# Altium integrated library WS-DITU.intlib: 38 symbols
Pins are listed as number, name and electrical type; pins without a type are passive.

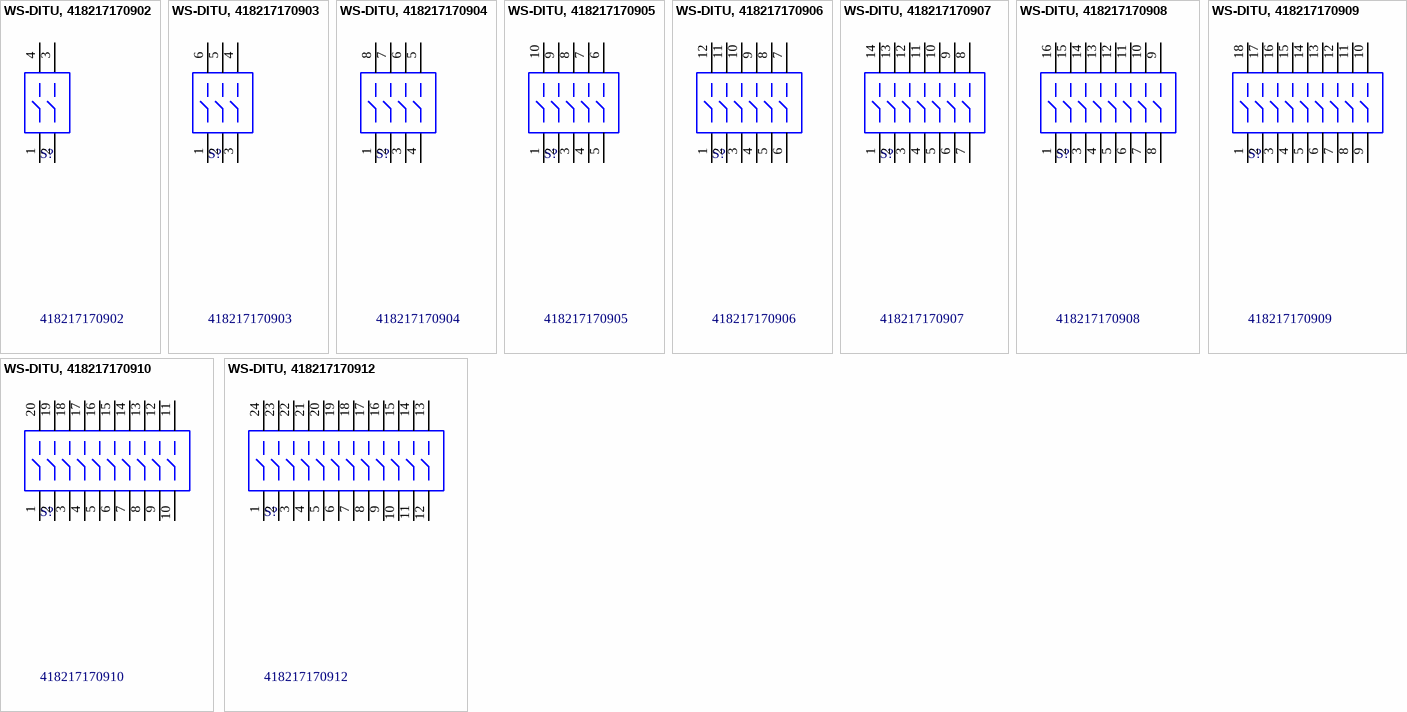
[diagram p0: symbols WS-DITU, 418217170902 to WS-DITU, 418217170912]

## WS-DITU, 418217170902
designator S?, comment 418217170902
WS-DITU 2.54 mm compact THT right angled with flat actuator; Manufacturer: Wurth Elektronik; ComponentLink1 Description: Manufacturer; ComponentLink2 Description: Datasheet; NoPoles: 2; Created Date: Dec.2015; partNo: 418217170902; ComponentLink1URL: http://www.we-online.com; ComponentLink2URL: http://katalog.we-online.de/em/datasheet/4182171709xx.pdf; Created by: Baojun Chen
footprint 418217170902 (02p, 2.54mm Pitch, Right Angled, Box Type, THT, flat Actuator, red, without Tape, Tube)
pins: 1, 2, 3, 4

## WS-DITU, 418217170903
designator S?, comment 418217170903
WS-DITU 2.54 mm compact THT right angled with flat actuator; Manufacturer: Wurth Elektronik; ComponentLink1 Description: Manufacturer; ComponentLink2 Description: Datasheet; NoPoles: 3; Created Date: Dec.2015; partNo: 418217170903; ComponentLink1URL: http://www.we-online.com; ComponentLink2URL: http://katalog.we-online.de/em/datasheet/4182171709xx.pdf; Created by: Baojun Chen
footprint 418217170903 (03p, 2.54mm Pitch, Right Angled, Box Type, THT, flat Actuator, red, without Tape, Tube)
pins: 1, 2, 3, 4, 5, 6

## WS-DITU, 418217170904
designator S?, comment 418217170904
WS-DITU 2.54 mm compact THT right angled with flat actuator; Manufacturer: Wurth Elektronik; ComponentLink1 Description: Manufacturer; ComponentLink2 Description: Datasheet; NoPoles: 4; Created Date: Dec.2015; partNo: 418217170904; ComponentLink1URL: http://www.we-online.com; ComponentLink2URL: http://katalog.we-online.de/em/datasheet/4182171709xx.pdf; Created by: Baojun Chen
footprint 418217170904 (04p, 2.54mm Pitch, Right Angled, Box Type, THT, flat Actuator, red, without Tape, Tube)
pins: 1, 2, 3, 4, 5, 6, 7, 8

## WS-DITU, 418217170905
designator S?, comment 418217170905
WS-DITU 2.54 mm compact THT right angled with flat actuator; Manufacturer: Wurth Elektronik; ComponentLink1 Description: Manufacturer; ComponentLink2 Description: Datasheet; NoPoles: 5; Created Date: Dec.2015; partNo: 418217170905; ComponentLink1URL: http://www.we-online.com; ComponentLink2URL: http://katalog.we-online.de/em/datasheet/4182171709xx.pdf; Created by: Baojun Chen
footprint 418217170905 (05p, 2.54mm Pitch, Right Angled, Box Type, THT, flat Actuator, red, without Tape, Tube)
pins: 1, 2, 3, 4, 5, 6, 7, 8, 9, 10

## WS-DITU, 418217170906
designator S?, comment 418217170906
WS-DITU 2.54 mm compact THT right angled with flat actuator; Manufacturer: Wurth Elektronik; ComponentLink1 Description: Manufacturer; ComponentLink2 Description: Datasheet; NoPoles: 6; Created Date: Dec.2015; partNo: 418217170906; ComponentLink1URL: http://www.we-online.com; ComponentLink2URL: http://katalog.we-online.de/em/datasheet/4182171709xx.pdf; Created by: Baojun Chen
footprint 418217170906 (06p, 2.54mm Pitch, Right Angled, Box Type, THT,flat Actuator, red, without Tape, Tube)
pins: 1, 2, 3, 4, 5, 6, 7, 8, 9, 10, 11, 12

## WS-DITU, 418217170907
designator S?, comment 418217170907
WS-DITU 2.54 mm compact THT right angled with flat actuator; Manufacturer: Wurth Elektronik; ComponentLink1 Description: Manufacturer; ComponentLink2 Description: Datasheet; NoPoles: 7; Created Date: Dec.2015; partNo: 418217170907; ComponentLink1URL: http://www.we-online.com; ComponentLink2URL: http://katalog.we-online.de/em/datasheet/4182171709xx.pdf; Created by: Baojun Chen
footprint 418217170907 (07p, 2.54mm Pitch, Right Angled, Box Type, THT, flat Actuator, red, without Tape, Tube)
pins: 1, 2, 3, 4, 5, 6, 7, 8, 9, 10, 11, 12, 13, 14

## WS-DITU, 418217170908
designator S?, comment 418217170908
WS-DITU 2.54 mm compact THT right angled with flat actuator; Manufacturer: Wurth Elektronik; ComponentLink1 Description: Manufacturer; ComponentLink2 Description: Datasheet; NoPoles: 8; Created Date: Dec.2015; partNo: 418217170908; ComponentLink1URL: http://www.we-online.com; ComponentLink2URL: http://katalog.we-online.de/em/datasheet/4182171709xx.pdf; Created by: Baojun Chen
footprint 418217170908 (08p, 2.54mm Pitch, Right Angled, Box Type, THT, flat Actuator, red, without Tape, Tube)
pins: 1, 2, 3, 4, 5, 6, 7, 8, 9, 10, 11, 12, 13, 14, 15, 16

## WS-DITU, 418217170909
designator S?, comment 418217170909
WS-DITU 2.54 mm compact THT right angled with flat actuator; Manufacturer: Wurth Elektronik; ComponentLink1 Description: Manufacturer; ComponentLink2 Description: Datasheet; NoPoles: 9; Created Date: Dec.2015; partNo: 418217170909; ComponentLink1URL: http://www.we-online.com; ComponentLink2URL: http://katalog.we-online.de/em/datasheet/4182171709xx.pdf; Created by: Baojun Chen
footprint 418217170909 (09p, 2.54mm Pitch, Right Angled, Box Type, THT, flat Actuator, red, without Tape, Tube)
pins: 1, 2, 3, 4, 5, 6, 7, 8, 9, 10, 11, 12, 13, 14, 15, 16, 17, 18

## WS-DITU, 418217170910
designator S?, comment 418217170910
WS-DITU 2.54 mm compact THT right angled with flat actuator; Manufacturer: Wurth Elektronik; ComponentLink1 Description: Manufacturer; ComponentLink2 Description: Datasheet; NoPoles: 10; Created Date: Dec.2015; partNo: 418217170910; ComponentLink1URL: http://www.we-online.com; ComponentLink2URL: http://katalog.we-online.de/em/datasheet/4182171709xx.pdf; Created by: Baojun Chen
footprint 418217170910 (10p, 2.54mm Pitch, Right Angled, Box Type, THT,flat Actuator, red, without Tape, Tube)
pins: 1, 2, 3, 4, 5, 6, 7, 8, 9, 10, 11, 12, 13, 14, 15, 16, 17, 18, 19, 20

## WS-DITU, 418217170912
designator S?, comment 418217170912
WS-DITU 2.54 mm compact THT right angled with flat actuator; Manufacturer: Wurth Elektronik; ComponentLink1 Description: Manufacturer; ComponentLink2 Description: Datasheet; NoPoles: 12; Created Date: Dec.2015; partNo: 418217170912; ComponentLink1URL: http://www.we-online.com; ComponentLink2URL: http://katalog.we-online.de/em/datasheet/4182171709xx.pdf; Created by: Baojun Chen
footprint 418217170912 (12p, 2.54mm Pitch, Right Angled, Box Type, THT, flat Actuator, red, without Tape, Tube)
pins: 1, 2, 3, 4, 5, 6, 7, 8, 9, 10, 11, 12, 13, 14, 15, 16, 17, 18, 19, 20, 21, 22, 23, 24


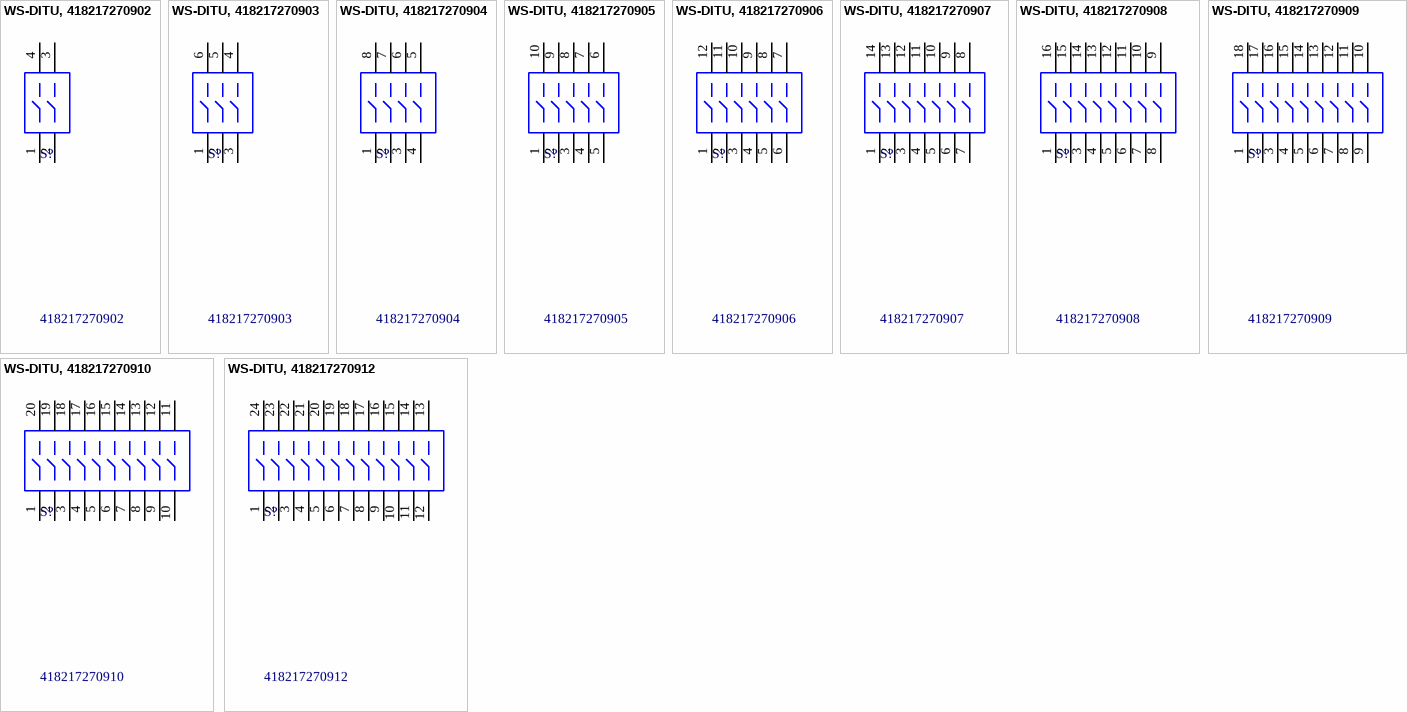
[diagram p1: symbols WS-DITU, 418217270902 to WS-DITU, 418217270912]

## WS-DITU, 418217270902
designator S?, comment 418217270902
WS-DITU 2.54 mm compact THT right angled with raised actuator; Manufacturer: Wurth Elektronik; ComponentLink1 Description: Manufacturer; ComponentLink2 Description: Datasheet; NoPoles: 2; Created Date: Dec.2015; partNo: 418217270902; ComponentLink1URL: http://www.we-online.com; ComponentLink2URL: http://katalog.we-online.de/em/datasheet/4182172709xx.pdf; Created by: Baojun Chen
footprint 418217270902 (02p, 2.54mm Pitch, Right Angled, Box Type, THT, raised Actuator, red, without Tape, Tube)
pins: 1, 2, 3, 4

## WS-DITU, 418217270903
designator S?, comment 418217270903
WS-DITU 2.54 mm compact THT right angled with raised actuator; Manufacturer: Wurth Elektronik; ComponentLink1 Description: Manufacturer; ComponentLink2 Description: Datasheet; NoPoles: 3; Created Date: Dec.2015; partNo: 418217270903; ComponentLink1URL: http://www.we-online.com; ComponentLink2URL: http://katalog.we-online.de/em/datasheet/4182172709xx.pdf; Created by: Baojun Chen
footprint 418217270903 (03p, 2.54mm Pitch, Right Angled, Box Type, THT, raised Actuator, red, without Tape, Tube)
pins: 1, 2, 3, 4, 5, 6

## WS-DITU, 418217270904
designator S?, comment 418217270904
WS-DITU 2.54 mm compact THT right angled with raised actuator; Manufacturer: Wurth Elektronik; ComponentLink1 Description: Manufacturer; ComponentLink2 Description: Datasheet; NoPoles: 4; Created Date: Dec.2015; partNo: 418217270904; ComponentLink1URL: http://www.we-online.com; ComponentLink2URL: http://katalog.we-online.de/em/datasheet/4182172709xx.pdf; Created by: Baojun Chen
footprint 418217270904 (04p, 2.54mm Pitch, Right Angled, Box Type, THT, raised Actuator, red, without Tape, Tube)
pins: 1, 2, 3, 4, 5, 6, 7, 8

## WS-DITU, 418217270905
designator S?, comment 418217270905
WS-DITU 2.54 mm compact THT right angled with raised actuator; Manufacturer: Wurth Elektronik; ComponentLink1 Description: Manufacturer; ComponentLink2 Description: Datasheet; NoPoles: 5; Created Date: Dec.2015; partNo: 418217270905; ComponentLink1URL: http://www.we-online.com; ComponentLink2URL: http://katalog.we-online.de/em/datasheet/4182172709xx.pdf; Created by: Baojun Chen
footprint 418217270905 (05p, 2.54mm Pitch, Right Angled, Box Type, THT, raised Actuator, red, without Tape, Tube)
pins: 1, 2, 3, 4, 5, 6, 7, 8, 9, 10

## WS-DITU, 418217270906
designator S?, comment 418217270906
WS-DITU 2.54 mm compact THT right angled with raised actuator; Manufacturer: Wurth Elektronik; ComponentLink1 Description: Manufacturer; ComponentLink2 Description: Datasheet; NoPoles: 6; Created Date: Dec.2015; partNo: 418217270906; ComponentLink1URL: http://www.we-online.com; ComponentLink2URL: http://katalog.we-online.de/em/datasheet/4182172709xx.pdf; Created by: Baojun Chen
footprint 418217270906 (06p, 2.54mm Pitch, Right Angled, Box Type, THT, raised Actuator, red, without Tape, Tube)
pins: 1, 2, 3, 4, 5, 6, 7, 8, 9, 10, 11, 12

## WS-DITU, 418217270907
designator S?, comment 418217270907
WS-DITU 2.54 mm compact THT right angled with raised actuator; Manufacturer: Wurth Elektronik; ComponentLink1 Description: Manufacturer; ComponentLink2 Description: Datasheet; NoPoles: 7; Created Date: Dec.2015; partNo: 418217270907; ComponentLink1URL: http://www.we-online.com; ComponentLink2URL: http://katalog.we-online.de/em/datasheet/4182172709xx.pdf; Created by: Baojun Chen
footprint 418217270907 (07p, 2.54mm Pitch, Right Angled, Box Type, THT, raised Actuator, red, without Tape, Tube)
pins: 1, 2, 3, 4, 5, 6, 7, 8, 9, 10, 11, 12, 13, 14

## WS-DITU, 418217270908
designator S?, comment 418217270908
WS-DITU 2.54 mm compact THT right angled with raised actuator; Manufacturer: Wurth Elektronik; ComponentLink1 Description: Manufacturer; ComponentLink2 Description: Datasheet; NoPoles: 8; Created Date: Dec.2015; partNo: 418217270908; ComponentLink1URL: http://www.we-online.com; ComponentLink2URL: http://katalog.we-online.de/em/datasheet/4182172709xx.pdf; Created by: Baojun Chen
footprint 418217270908 (08p, 2.54mm Pitch, Right Angled, Box Type, THT, raised Actuator, red, without Tape, Tube)
pins: 1, 2, 3, 4, 5, 6, 7, 8, 9, 10, 11, 12, 13, 14, 15, 16

## WS-DITU, 418217270909
designator S?, comment 418217270909
WS-DITU 2.54 mm compact THT right angled with raised actuator; Manufacturer: Wurth Elektronik; ComponentLink1 Description: Manufacturer; ComponentLink2 Description: Datasheet; NoPoles: 9; Created Date: Dec.2015; partNo: 418217270909; ComponentLink1URL: http://www.we-online.com; ComponentLink2URL: http://katalog.we-online.de/em/datasheet/4182172709xx.pdf; Created by: Baojun Chen
footprint 418217270909 (09p, 2.54mm Pitch, Right Angled, Box Type, THT, raised Actuator, red, without Tape, Tube)
pins: 1, 2, 3, 4, 5, 6, 7, 8, 9, 10, 11, 12, 13, 14, 15, 16, 17, 18

## WS-DITU, 418217270910
designator S?, comment 418217270910
WS-DITU 2.54 mm compact THT right angled with raised actuator; Manufacturer: Wurth Elektronik; ComponentLink1 Description: Manufacturer; ComponentLink2 Description: Datasheet; NoPoles: 10; Created Date: Dec.2015; partNo: 418217270910; ComponentLink1URL: http://www.we-online.com; ComponentLink2URL: http://katalog.we-online.de/em/datasheet/4182172709xx.pdf; Created by: Baojun Chen
footprint 418217270910 (10p, 2.54mm Pitch, Right Angled, Box Type, THT, raised Actuator, red, without Tape, Tube)
pins: 1, 2, 3, 4, 5, 6, 7, 8, 9, 10, 11, 12, 13, 14, 15, 16, 17, 18, 19, 20

## WS-DITU, 418217270912
designator S?, comment 418217270912
WS-DITU 2.54 mm compact THT right angled with raised actuator; Manufacturer: Wurth Elektronik; ComponentLink1 Description: Manufacturer; ComponentLink2 Description: Datasheet; NoPoles: 12; Created Date: Dec.2015; partNo: 418217270912; ComponentLink1URL: http://www.we-online.com; ComponentLink2URL: http://katalog.we-online.de/em/datasheet/4182172709xx.pdf; Created by: Baojun Chen
footprint 418217270912 (12p, 2.54mm Pitch, Right Angled, Box Type, THT, raised Actuator, red, without Tape, Tube)
pins: 1, 2, 3, 4, 5, 6, 7, 8, 9, 10, 11, 12, 13, 14, 15, 16, 17, 18, 19, 20, 21, 22, 23, 24


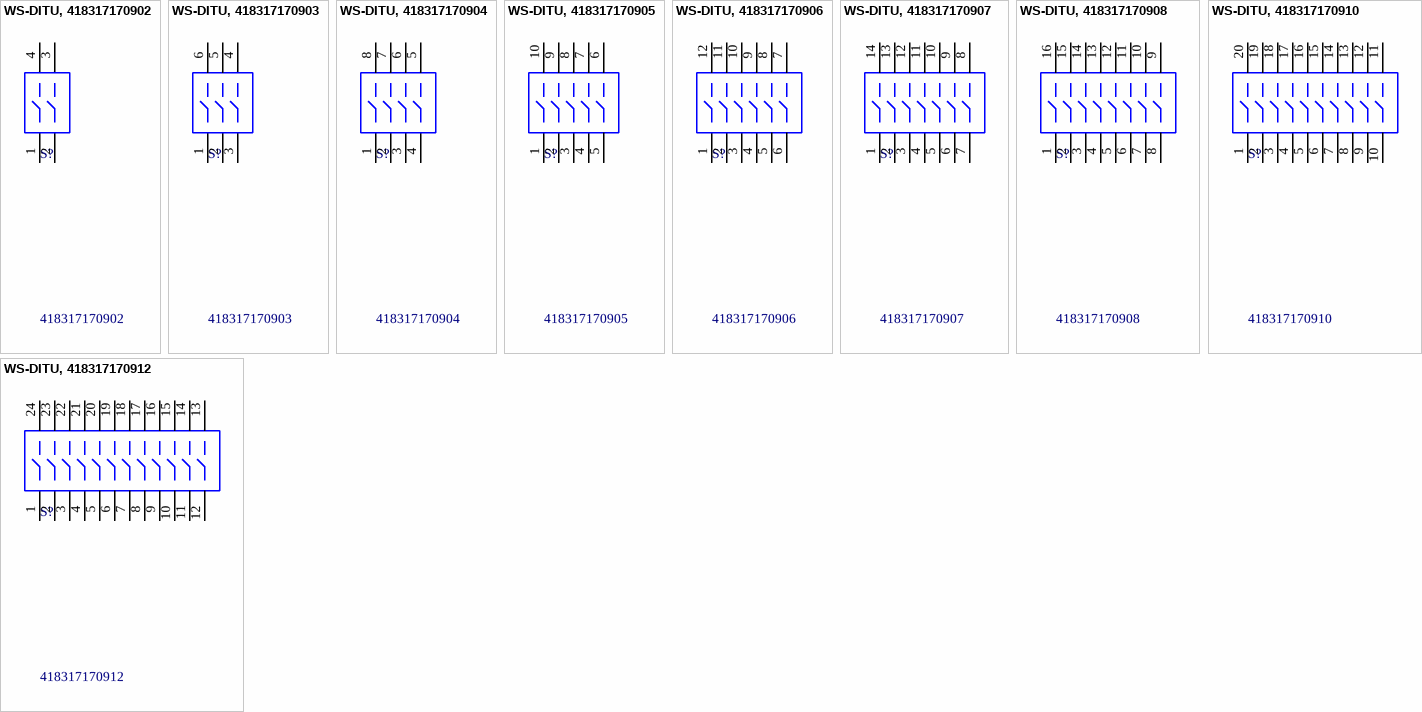
[diagram p2: symbols WS-DITU, 418317170902 to WS-DITU, 418317170912]

## WS-DITU, 418317170902
designator S?, comment 418317170902
WS-DITU 2.54 mm compact THT right angled with flat actuator; Manufacturer: Wurth Elektronik; ComponentLink1 Description: Manufacturer; ComponentLink2 Description: Datasheet; NoPoles: 2; Created Date: Dec.2015; partNo: 418317170902; ComponentLink1URL: http://www.we-online.com; ComponentLink2URL: http://katalog.we-online.de/em/datasheet/4183171709xx.pdf; Created by: Baojun Chen
footprint 418317170902 (02p, 2.54mm Pitch, Piano, Box Type, THT, flat Actuator, black, without Tape, Tube)
pins: 1, 2, 3, 4

## WS-DITU, 418317170903
designator S?, comment 418317170903
WS-DITU 2.54 mm compact THT right angled with flat actuator; Manufacturer: Wurth Elektronik; ComponentLink1 Description: Manufacturer; ComponentLink2 Description: Datasheet; NoPoles: 3; Created Date: Dec.2015; partNo: 418317170903; ComponentLink1URL: http://www.we-online.com; ComponentLink2URL: http://katalog.we-online.de/em/datasheet/4183171709xx.pdf; Created by: Baojun Chen
footprint 418317170903 (03p, 2.54mm Pitch, Piano, Box Type, THT, flat Actuator, black, without Tape, Tube)
pins: 1, 2, 3, 4, 5, 6

## WS-DITU, 418317170904
designator S?, comment 418317170904
WS-DITU 2.54 mm compact THT right angled with flat actuator; Manufacturer: Wurth Elektronik; ComponentLink1 Description: Manufacturer; ComponentLink2 Description: Datasheet; NoPoles: 4; Created Date: Dec.2015; partNo: 418317170904; ComponentLink1URL: http://www.we-online.com; ComponentLink2URL: http://katalog.we-online.de/em/datasheet/4183171709xx.pdf; Created by: Baojun Chen
footprint 418317170904 (04p, 2.54mm Pitch, Piano, Box Type, THT, flat Actuator, black, without Tape, Tube)
pins: 1, 2, 3, 4, 5, 6, 7, 8

## WS-DITU, 418317170905
designator S?, comment 418317170905
WS-DITU 2.54 mm compact THT right angled with flat actuator; Manufacturer: Wurth Elektronik; ComponentLink1 Description: Manufacturer; ComponentLink2 Description: Datasheet; NoPoles: 5; Created Date: Dec.2015; partNo: 418317170905; ComponentLink1URL: http://www.we-online.com; ComponentLink2URL: http://katalog.we-online.de/em/datasheet/4183171709xx.pdf; Created by: Baojun Chen
footprint 418317170905 (05p, 2.54mm Pitch, Piano, Box Type, THT, flat Actuator, black, without Tape, Tube)
pins: 1, 2, 3, 4, 5, 6, 7, 8, 9, 10

## WS-DITU, 418317170906
designator S?, comment 418317170906
WS-DITU 2.54 mm compact THT right angled with flat actuator; Manufacturer: Wurth Elektronik; ComponentLink1 Description: Manufacturer; ComponentLink2 Description: Datasheet; NoPoles: 6; Created Date: Dec.2015; partNo: 418317170906; ComponentLink1URL: http://www.we-online.com; ComponentLink2URL: http://katalog.we-online.de/em/datasheet/4183171709xx.pdf; Created by: Baojun Chen
footprint 418317170906 (06p, 2.54mm Pitch, Piano, Box Type, THT, flat Actuator, black, without Tape, Tube)
pins: 1, 2, 3, 4, 5, 6, 7, 8, 9, 10, 11, 12

## WS-DITU, 418317170907
designator S?, comment 418317170907
WS-DITU 2.54 mm compact THT right angled with flat actuator; Manufacturer: Wurth Elektronik; ComponentLink1 Description: Manufacturer; ComponentLink2 Description: Datasheet; NoPoles: 7; Created Date: Dec.2015; partNo: 418317170907; ComponentLink1URL: http://www.we-online.com; ComponentLink2URL: http://katalog.we-online.de/em/datasheet/4183171709xx.pdf; Created by: Baojun Chen
footprint 418317170907 (07p, 2.54mm Pitch, Piano, Box Type, THT, flat Actuator, black, without Tape, Tube)
pins: 1, 2, 3, 4, 5, 6, 7, 8, 9, 10, 11, 12, 13, 14

## WS-DITU, 418317170908
designator S?, comment 418317170908
WS-DITU 2.54 mm compact THT right angled with flat actuator; Manufacturer: Wurth Elektronik; ComponentLink1 Description: Manufacturer; ComponentLink2 Description: Datasheet; NoPoles: 8; Created Date: Dec.2015; partNo: 418317170908; ComponentLink1URL: http://www.we-online.com; ComponentLink2URL: http://katalog.we-online.de/em/datasheet/4183171709xx.pdf; Created by: Baojun Chen
footprint 418317170908 (08p, 2.54mm Pitch, Piano, Box Type, THT, flat Actuator, black, without Tape, Tube)
pins: 1, 2, 3, 4, 5, 6, 7, 8, 9, 10, 11, 12, 13, 14, 15, 16

## WS-DITU, 418317170910
designator S?, comment 418317170910
WS-DITU 2.54 mm compact THT right angled with flat actuator; Manufacturer: Wurth Elektronik; ComponentLink1 Description: Manufacturer; ComponentLink2 Description: Datasheet; NoPoles: 10; Created Date: Dec.2015; partNo: 418317170910; ComponentLink1URL: http://www.we-online.com; ComponentLink2URL: http://katalog.we-online.de/em/datasheet/4183171709xx.pdf; Created by: Baojun Chen
footprint 418317170910 (10p, 2.54mm Pitch, Piano, Box Type, THT, flat Actuator, black, without Tape, Tube)
pins: 1, 2, 3, 4, 5, 6, 7, 8, 9, 10, 11, 12, 13, 14, 15, 16, 17, 18, 19, 20

## WS-DITU, 418317170912
designator S?, comment 418317170912
WS-DITU 2.54 mm compact THT right angled with flat actuator; Manufacturer: Wurth Elektronik; ComponentLink1 Description: Manufacturer; ComponentLink2 Description: Datasheet; NoPoles: 12; Created Date: Dec.2015; partNo: 418317170912; ComponentLink1URL: http://www.we-online.com; ComponentLink2URL: http://katalog.we-online.de/em/datasheet/4183171709xx.pdf; Created by: Baojun Chen
footprint 418317170912 (12p, 2.54mm Pitch, Piano, Box Type, THT, flat Actuator, black, without Tape, Tube)
pins: 1, 2, 3, 4, 5, 6, 7, 8, 9, 10, 11, 12, 13, 14, 15, 16, 17, 18, 19, 20, 21, 22, 23, 24


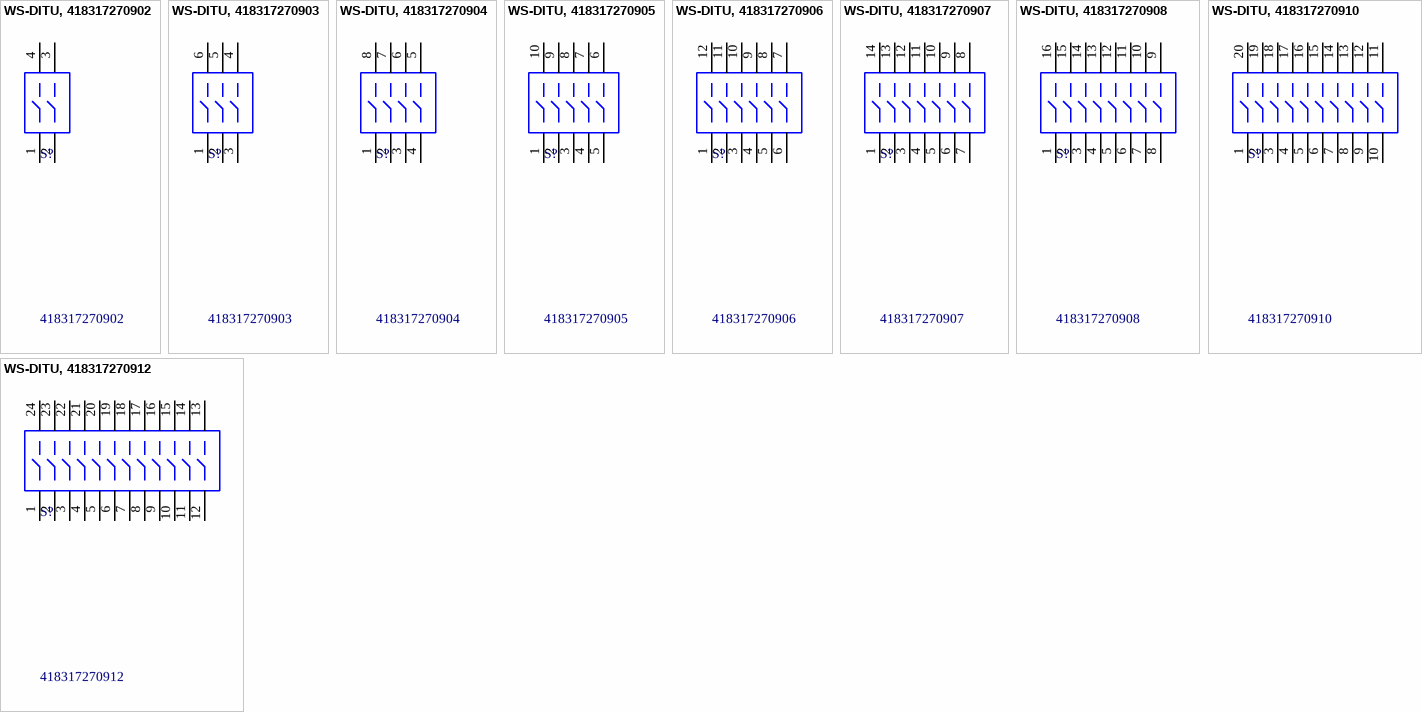
[diagram p3: symbols WS-DITU, 418317270902 to WS-DITU, 418317270912]

## WS-DITU, 418317270902
designator S?, comment 418317270902
WS-DITU 2.54 mm compact THT piano type with raised actuator; Manufacturer: Wurth Elektronik; ComponentLink1 Description: Manufacturer; ComponentLink2 Description: Datasheet; NoPoles: 2; Created Date: Dec.2015; partNo: 418317270902; ComponentLink1URL: http://www.we-online.com; ComponentLink2URL: http://katalog.we-online.de/em/datasheet/4183172709xx.pdf; Created by: Baojun Chen
footprint 418317270902 (02p, 2.54mm Pitch, Piano, Box Type, THT, raised Actuator, black, without Tape, Tube)
pins: 1, 2, 3, 4

## WS-DITU, 418317270903
designator S?, comment 418317270903
WS-DITU 2.54 mm compact THT piano type with raised actuator; Manufacturer: Wurth Elektronik; ComponentLink1 Description: Manufacturer; ComponentLink2 Description: Datasheet; NoPoles: 3; Created Date: Dec.2015; partNo: 418317270903; ComponentLink1URL: http://www.we-online.com; ComponentLink2URL: http://katalog.we-online.de/em/datasheet/4183172709xx.pdf; Created by: Baojun Chen
footprint 418317270903 (03p, 2.54mm Pitch, Piano, Box Type, THT, raised Actuator, black, without Tape, Tube)
pins: 1, 2, 3, 4, 5, 6

## WS-DITU, 418317270904
designator S?, comment 418317270904
WS-DITU 2.54 mm compact THT piano type with raised actuator; Manufacturer: Wurth Elektronik; ComponentLink1 Description: Manufacturer; ComponentLink2 Description: Datasheet; NoPoles: 4; Created Date: Dec.2015; partNo: 418317270904; ComponentLink1URL: http://www.we-online.com; ComponentLink2URL: http://katalog.we-online.de/em/datasheet/4183172709xx.pdf; Created by: Baojun Chen
footprint 418317270904 (04p, 2.54mm Pitch, Piano, Box Type, THT, raised Actuator, black, without Tape, Tube)
pins: 1, 2, 3, 4, 5, 6, 7, 8

## WS-DITU, 418317270905
designator S?, comment 418317270905
WS-DITU 2.54 mm compact THT piano type with raised actuator; Manufacturer: Wurth Elektronik; ComponentLink1 Description: Manufacturer; ComponentLink2 Description: Datasheet; NoPoles: 5; Created Date: Dec.2015; partNo: 418317270905; ComponentLink1URL: http://www.we-online.com; ComponentLink2URL: http://katalog.we-online.de/em/datasheet/4183172709xx.pdf; Created by: Baojun Chen
footprint 418317270905 (05p, 2.54mm Pitch, Piano, Box Type, THT, raised Actuator, black, without Tape, Tube)
pins: 1, 2, 3, 4, 5, 6, 7, 8, 9, 10

## WS-DITU, 418317270906
designator S?, comment 418317270906
WS-DITU 2.54 mm compact THT piano type with raised actuator; Manufacturer: Wurth Elektronik; ComponentLink1 Description: Manufacturer; ComponentLink2 Description: Datasheet; NoPoles: 6; Created Date: Dec.2015; partNo: 418317270906; ComponentLink1URL: http://www.we-online.com; ComponentLink2URL: http://katalog.we-online.de/em/datasheet/4183172709xx.pdf; Created by: Baojun Chen
footprint 418317270906 (06p, 2.54mm Pitch, Piano, Box Type, THT, raised Actuator, black, without Tape, Tube)
pins: 1, 2, 3, 4, 5, 6, 7, 8, 9, 10, 11, 12

## WS-DITU, 418317270907
designator S?, comment 418317270907
WS-DITU 2.54 mm compact THT piano type with raised actuator; Manufacturer: Wurth Elektronik; ComponentLink1 Description: Manufacturer; ComponentLink2 Description: Datasheet; NoPoles: 7; Created Date: Dec.2015; partNo: 418317270907; ComponentLink1URL: http://www.we-online.com; ComponentLink2URL: http://katalog.we-online.de/em/datasheet/4183172709xx.pdf; Created by: Baojun Chen
footprint 418317270907 (07p, 2.54mm Pitch, Piano, Box Type, THT, raised Actuator, black, without Tape, Tube)
pins: 1, 2, 3, 4, 5, 6, 7, 8, 9, 10, 11, 12, 13, 14

## WS-DITU, 418317270908
designator S?, comment 418317270908
WS-DITU 2.54 mm compact THT piano type with raised actuator; Manufacturer: Wurth Elektronik; ComponentLink1 Description: Manufacturer; ComponentLink2 Description: Datasheet; NoPoles: 8; Created Date: Dec.2015; partNo: 418317270908; ComponentLink1URL: http://www.we-online.com; ComponentLink2URL: http://katalog.we-online.de/em/datasheet/4183172709xx.pdf; Created by: Baojun Chen
footprint 418317270908 (08p, 2.54mm Pitch, Piano, Box Type, THT, raised Actuator, black, without Tape, Tube)
pins: 1, 2, 3, 4, 5, 6, 7, 8, 9, 10, 11, 12, 13, 14, 15, 16

## WS-DITU, 418317270910
designator S?, comment 418317270910
WS-DITU 2.54 mm compact THT piano type with raised actuator; Manufacturer: Wurth Elektronik; ComponentLink1 Description: Manufacturer; ComponentLink2 Description: Datasheet; NoPoles: 10; Created Date: Dec.2015; partNo: 418317270910; ComponentLink1URL: http://www.we-online.com; ComponentLink2URL: http://katalog.we-online.de/em/datasheet/4183172709xx.pdf; Created by: Baojun Chen
footprint 418317270910 (10p, 2.54mm Pitch, Piano, Box Type, THT, raised Actuator, black, without Tape, Tube)
pins: 1, 2, 3, 4, 5, 6, 7, 8, 9, 10, 11, 12, 13, 14, 15, 16, 17, 18, 19, 20

## WS-DITU, 418317270912
designator S?, comment 418317270912
WS-DITU 2.54 mm compact THT piano type with raised actuator; Manufacturer: Wurth Elektronik; ComponentLink1 Description: Manufacturer; ComponentLink2 Description: Datasheet; NoPoles: 12; Created Date: Dec.2015; partNo: 418317270912; ComponentLink1URL: http://www.we-online.com; ComponentLink2URL: http://katalog.we-online.de/em/datasheet/4183172709xx.pdf; Created by: Baojun Chen
footprint 418317270912 (12p, 2.54mm Pitch, Piano, Box Type, THT, raised Actuator, black, without Tape, Tube)
pins: 1, 2, 3, 4, 5, 6, 7, 8, 9, 10, 11, 12, 13, 14, 15, 16, 17, 18, 19, 20, 21, 22, 23, 24